# Altium footprint library IC SMD DUAL.PCBLIB: 128 footprints (part 4 of 8)
Each footprint in its own frame and in the unit in brackets; x right, y up, seen from the top. Pads: shape width x height; smd on the part's side, far side on the other; paste and mask are expansions set on the pad; w line width, h text height; cw(c..) or ccw(c..) is an arc to the next point about the centre after c.
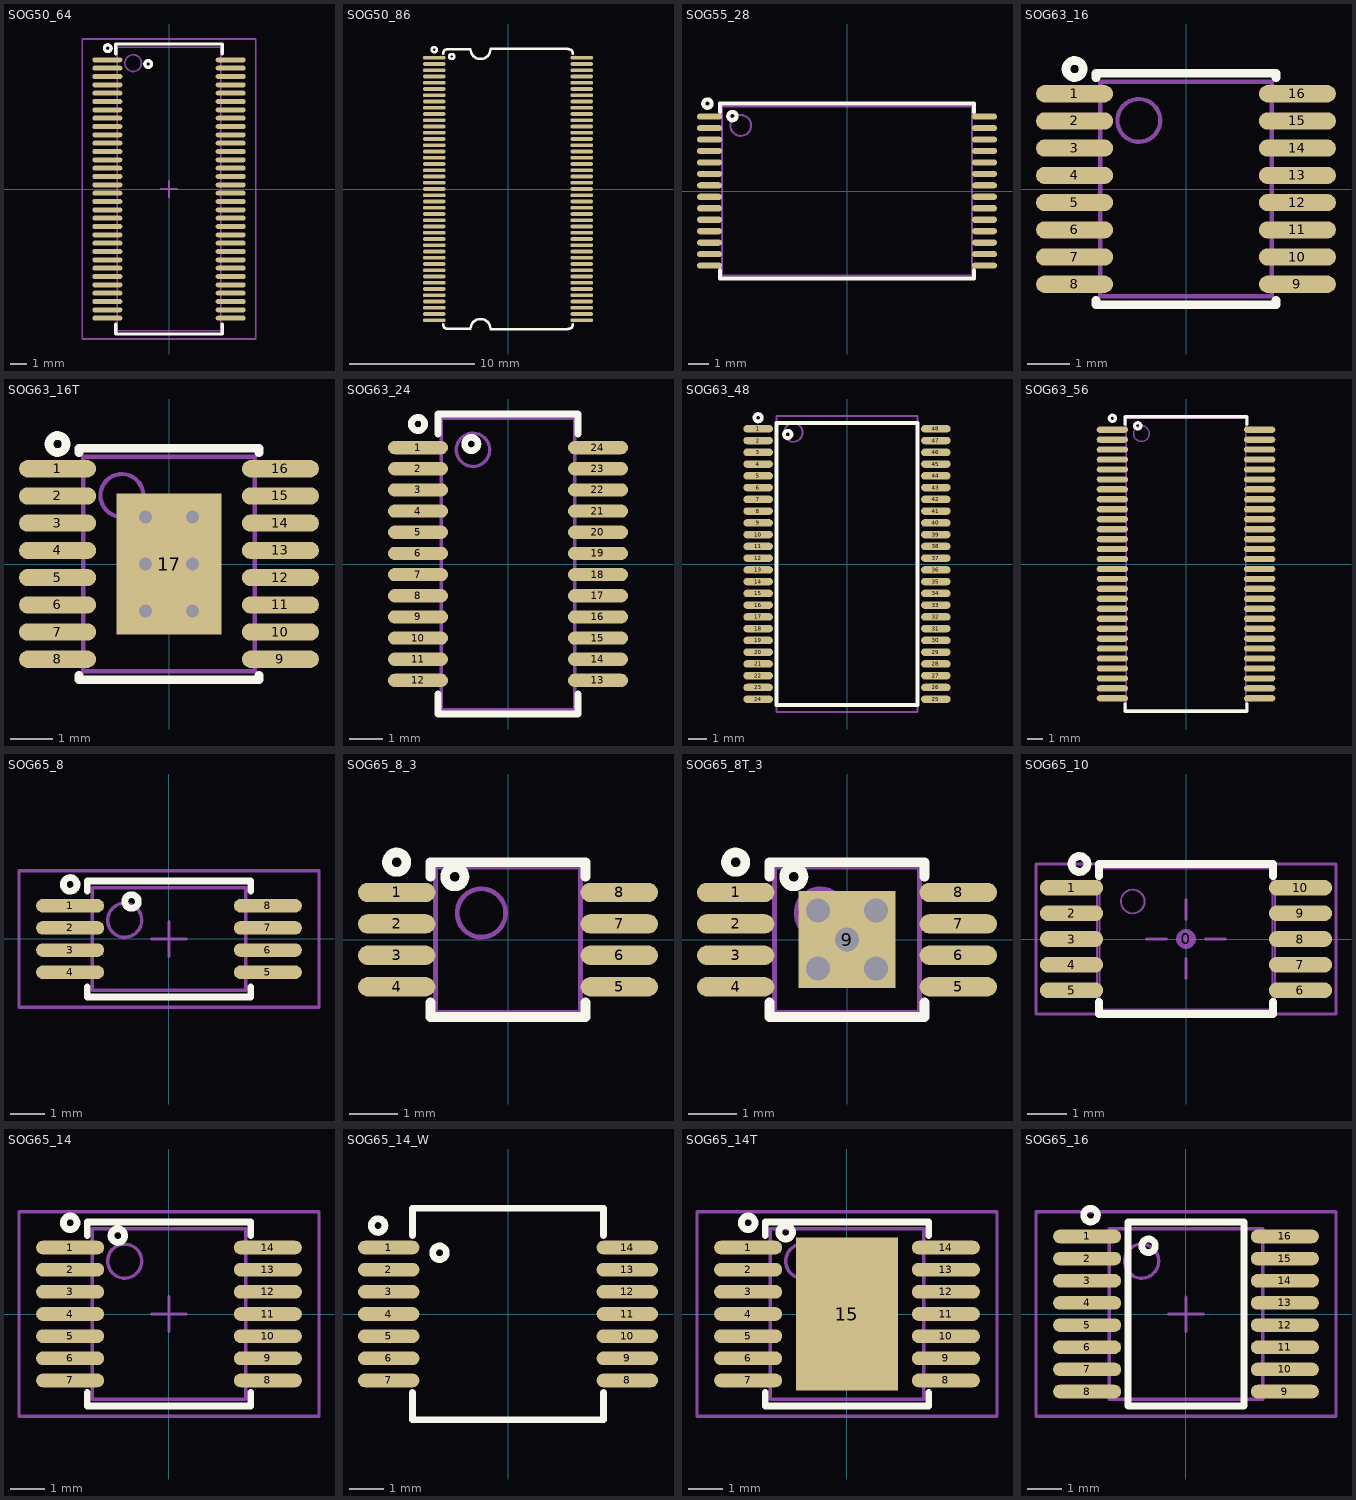
[diagram p3: the footprints below, top view; thin cyan lines are the x and y axes]

## SOG50_64 [mm] "DGG TSSOP (TI), MO-153 (JEDEC), 64Lead, pitch: 0.5mm, 17x6.1x1.2mm"
height 1.2
pads (64):
  oval 1.8x0.3 smd mask+0.075: 1(-3.7,7.75) 2(-3.7,7.25) 3(-3.7,6.75) 4(-3.7,6.25) 5(-3.7,5.75) 6(-3.7,5.25) 7(-3.7,4.75) 8(-3.7,4.25) 9(-3.7,3.75) 10(-3.7,3.25) 11(-3.7,2.75) 12(-3.7,2.25) 13(-3.7,1.75) 14(-3.7,1.25) 15(-3.7,0.75) 16(-3.7,0.25) 17(-3.7,-0.25) 18(-3.7,-0.75) 19(-3.7,-1.25) 20(-3.7,-1.75) 21(-3.7,-2.25) 22(-3.7,-2.75) 23(-3.7,-3.25) 24(-3.7,-3.75) 25(-3.7,-4.25) 26(-3.7,-4.75) 27(-3.7,-5.25) 28(-3.7,-5.75) 29(-3.7,-6.25) 30(-3.7,-6.75) 31(-3.7,-7.25) 32(-3.7,-7.75) 33(3.7,-7.75) 34(3.7,-7.25) 35(3.7,-6.75) 36(3.7,-6.25) 37(3.7,-5.75) 38(3.7,-5.25) 39(3.7,-4.75) 40(3.7,-4.25) 41(3.7,-3.75) 42(3.7,-3.25) 43(3.7,-2.75) 44(3.7,-2.25) 45(3.7,-1.75) 46(3.7,-1.25) 47(3.7,-0.75) 48(3.7,-0.25) 49(3.7,0.25) 50(3.7,0.75) 51(3.7,1.25) 52(3.7,1.75) 53(3.7,2.25) 54(3.7,2.75) 55(3.7,3.25) 56(3.7,3.75) 57(3.7,4.25) 58(3.7,4.75) 59(3.7,5.25) 60(3.7,5.75) 61(3.7,6.25) 62(3.7,6.75) 63(3.7,7.25) 64(3.7,7.75)
TopOverlay:
  circle w0.2: c-1.25,7.5 r0.2
  circle w0.2: c-3.675,8.45 r0.2
  lines w0.2: -3.2,-8.1 -3.2,-8.7 3.2,-8.7 3.2,-8.1 ; -3.2,8.1 -3.2,8.7 3.2,8.7 3.2,8.1
Mechanical13:
  circle w0.1: c-2.15,7.55 r0.5
  lines w0.1: -3.1,-8.5 3.1,-8.5 3.1,8.5 -3.1,8.5 -3.1,-8.5
Mechanical15:
  lines w0.1: -0.5,0 0.5,0 ; 0,-0.5 0,0.5 ; -5.2,-9 5.2,-9 5.2,9 -5.2,9 -5.2,-9
3D body: height 1.2, standoff 0.05, extent -3.1,-8.5 3.1,8.5

## SOG50_86 [mm] "TSOPII-86"
pads (86):
  oval 1.8x0.3 smd mask+0.075: 1(-5.9,10.5) 2(-5.9,10) 3(-5.9,9.5) 4(-5.9,9) 5(-5.9,8.5) 6(-5.9,8) 7(-5.9,7.5) 8(-5.9,7) 9(-5.9,6.5) 10(-5.9,6) 11(-5.9,5.5) 12(-5.9,5) 13(-5.9,4.5) 14(-5.9,4) 15(-5.9,3.5) 16(-5.9,3) 17(-5.9,2.5) 18(-5.9,2) 19(-5.9,1.5) 20(-5.9,1) 21(-5.9,0.5) 22(-5.9,0) 23(-5.9,-0.5) 24(-5.9,-1) 25(-5.9,-1.5) 26(-5.9,-2) 27(-5.9,-2.5) 28(-5.9,-3) 29(-5.9,-3.5) 30(-5.9,-4) 31(-5.9,-4.5) 32(-5.9,-5) 33(-5.9,-5.5) 34(-5.9,-6) 35(-5.9,-6.5) 36(-5.9,-7) 37(-5.9,-7.5) 38(-5.9,-8) 39(-5.9,-8.5) 40(-5.9,-9) 41(-5.9,-9.5) 42(-5.9,-10) 43(-5.9,-10.5) 44(5.9,-10.5) 45(5.9,-10) 46(5.9,-9.5) 47(5.9,-9) 48(5.9,-8.5) 49(5.9,-8) 50(5.9,-7.5) 51(5.9,-7) 52(5.9,-6.5) 53(5.9,-6) 54(5.9,-5.5) 55(5.9,-5) 56(5.9,-4.5) 57(5.9,-4) 58(5.9,-3.5) 59(5.9,-3) 60(5.9,-2.5) 61(5.9,-2) 62(5.9,-1.5) 63(5.9,-1) 64(5.9,-0.5) 65(5.9,0) 66(5.9,0.5) 67(5.9,1) 68(5.9,1.5) 69(5.9,2) 70(5.9,2.5) 71(5.9,3) 72(5.9,3.5) 73(5.9,4) 74(5.9,4.5) 75(5.9,5) 76(5.9,5.5) 77(5.9,6) 78(5.9,6.5) 79(5.9,7) 80(5.9,7.5) 81(5.9,8) 82(5.9,8.5) 83(5.9,9) 84(5.9,9.5) 85(5.9,10) 86(5.9,10.5)
TopOverlay:
  circle w0.2: c-4.5,10.6 r0.2
  circle w0.2: c-5.9,11.145 r0.2
  lines w0.2: -5.2,-10.8 ccw(c-4.8,-10.8) -4.8,-11.2 -3,-11.2 cw(c-2.2,-11.2) -1.4,-11.2 ; -5.2,10.8 cw(c-4.8,10.8) -4.8,11.2 -3,11.2 ccw(c-2.2,11.2) -1.4,11.2 ; -1.4,-11.208 4.8,-11.208 ; -1.4,11.208 4.8,11.208 ; 4.8,-11.2 ccw(c4.8,-10.8) 5.2,-10.8 ; 4.8,11.2 cw(c4.8,10.8) 5.2,10.8
3D body "User Library-TSOP-86.STEP": height 1.06, standoff -0.03, extent -5.895,-11 5.895,10.994

## SOG55_28 [mm] "Z28, TSSOP, 28-Leads, Body 8.10x12.00mm, Pitch 0.55mm"
height 1.2
pads (28):
  oval 1.2x0.3 smd mask+0.075: 1(-6.6,3.575) 2(-6.6,3.025) 3(-6.6,2.475) 4(-6.6,1.925) 5(-6.6,1.375) 6(-6.6,0.825) 7(-6.6,0.275) 8(-6.6,-0.275) 9(-6.6,-0.825) 10(-6.6,-1.375) 11(-6.6,-1.925) 12(-6.6,-2.475) 13(-6.6,-3.025) 14(-6.6,-3.575) 15(6.6,-3.575) 16(6.6,-3.025) 17(6.6,-2.475) 18(6.6,-1.925) 19(6.6,-1.375) 20(6.6,-0.825) 21(6.6,-0.275) 22(6.6,0.275) 23(6.6,0.825) 24(6.6,1.375) 25(6.6,1.925) 26(6.6,2.475) 27(6.6,3.025) 28(6.6,3.575)
TopOverlay:
  circle w0.2: c-6.7,4.2 r0.2
  circle w0.2: c-5.5,3.6 r0.2
  lines w0.2: -6.1,-3.8 -6.1,-4.2 6.1,-4.2 6.1,-3.8 ; -6.1,3.8 -6.1,4.2 6.1,4.2 6.1,3.8
Mechanical13:
  circle w0.1: c-5.1,3.15 r0.5
  lines w0.1: -6,-4.05 -6,4.05 6,4.05 6,-4.05 -6,-4.05
3D body "SOG55_28.step": height 1.2, standoff 0, extent -6.8,-4.05 6.8,4.05

## SOG63_16 [mm] "SOP DBQ, QSOP, 16-Leads, Body 4.90x3.90mm, Pitch 0.635mm"
height 1.65
pads (16):
  oval 1.8x0.4 smd mask+0.075: 1(-2.6,2.222) 2(-2.6,1.587) 3(-2.6,0.953) 4(-2.6,0.318) 5(-2.6,-0.318) 6(-2.6,-0.953) 7(-2.6,-1.587) 8(-2.6,-2.222) 9(2.6,-2.222) 10(2.6,-1.587) 11(2.6,-0.953) 12(2.6,-0.318) 13(2.6,0.318) 14(2.6,0.953) 15(2.6,1.587) 16(2.6,2.222)
TopOverlay:
  circle w0.2: c-2.6,2.8 r0.2
  lines w0.2: -2.1,-2.6 -2.1,-2.7 2.1,-2.7 2.1,-2.6 ; -2.1,2.6 -2.1,2.7 2.1,2.7 2.1,2.6
Mechanical13:
  circle w0.1: c-1.1,1.6 r0.5
  lines w0.1: -2,-2.5 -2,2.5 2,2.5 2,-2.5 -2,-2.5
3D body "User Library-MAX_QSOP16.step": height 1.76, standoff -0.01, extent -3.01,-2.49 3.01,2.49

## SOG63_16T [mm] "SOP, 16-Leads, Body 4.90x3.90mm, Pitch 0.64mm, Thermal Pad 3.30.2x2.44.2mm, IPC Medium Density"
height 1.65
pads (17):
  oval 1.8x0.4 smd mask+0.075: 1(-2.6,2.222) 2(-2.6,1.587) 3(-2.6,0.953) 4(-2.6,0.318) 5(-2.6,-0.318) 6(-2.6,-0.953) 7(-2.6,-1.587) 8(-2.6,-2.222) 9(2.6,-2.222) 10(2.6,-1.587) 11(2.6,-0.953) 12(2.6,-0.318) 13(2.6,0.318) 14(2.6,0.953) 15(2.6,1.587) 16(2.6,2.222)
  rect 2.44x3.3 smd: 17(0,0)
via 0.55,-1.1 diameter 0.5 hole 0.3
via -0.55,-1.1 diameter 0.5 hole 0.3
via 0.55,0 diameter 0.5 hole 0.3
via -0.55,0 diameter 0.5 hole 0.3
via 0.55,1.1 diameter 0.5 hole 0.3
via -0.55,1.1 diameter 0.5 hole 0.3
TopOverlay:
  circle w0.2: c-2.6,2.8 r0.2
  lines w0.2: -2.1,-2.6 -2.1,-2.7 2.1,-2.7 2.1,-2.6 ; -2.1,2.6 -2.1,2.7 2.1,2.7 2.1,2.6
Mechanical13:
  circle w0.1: c-1.1,1.6 r0.5
  lines w0.1: -2,-2.5 2,-2.5 2,2.5 -2,2.5 -2,-2.5
3D body "User Library-MAX_QSOP16.step": height 1.76, standoff -0.01, extent -3.01,-2.49 3.01,2.49

## SOG63_24 [mm] "QSOP24, 8.6X3.9mm, 0.635mm pitch"
pads (24):
  oval 1.8x0.4 smd mask+0.075: 1(-2.7,3.492) 2(-2.7,2.857) 3(-2.7,2.222) 4(-2.7,1.587) 5(-2.7,0.953) 6(-2.7,0.318) 7(-2.7,-0.318) 8(-2.7,-0.953) 9(-2.7,-1.587) 10(-2.7,-2.222) 11(-2.7,-2.857) 12(-2.7,-3.492) 13(2.7,-3.492) 14(2.7,-2.857) 15(2.7,-2.222) 16(2.7,-1.587) 17(2.7,-0.953) 18(2.7,-0.318) 19(2.7,0.318) 20(2.7,0.953) 21(2.7,1.587) 22(2.7,2.222) 23(2.7,2.857) 24(2.7,3.492)
TopOverlay:
  circle w0.2: c-1.1,3.6 r0.2
  circle w0.2: c-2.7,4.2 r0.2
  lines w0.2: -2.1,-3.9 -2.1,-4.5 2.1,-4.5 2.1,-3.9 ; -2.1,3.9 -2.1,4.5 2.1,4.5 2.1,3.9
Mechanical13:
  circle w0.1: c-1.05,3.425 r0.5
  lines w0.1: -2,-4.375 2,-4.375 2,4.375 -2,4.375 -2,-4.375
3D body "User Library-QSOP24.step": height 1.73, standoff 0, extent -3.095,-5.01 3.095,5

## SOG63_48 [mm] "SOT370-1, MO-118, SSOP48, 7.5mm width, 0.635mm pitch"
pads (48):
  oval 1.6x0.4 smd mask+0.075: 1(-4.8,7.302) 2(-4.8,6.667) 3(-4.8,6.032) 4(-4.8,5.397) 5(-4.8,4.763) 6(-4.8,4.127) 7(-4.8,3.492) 8(-4.8,2.857) 9(-4.8,2.222) 10(-4.8,1.587) 11(-4.8,0.953) 12(-4.8,0.318) 13(-4.8,-0.318) 14(-4.8,-0.953) 15(-4.8,-1.587) 16(-4.8,-2.222) 17(-4.8,-2.857) 18(-4.8,-3.492) 19(-4.8,-4.127) 20(-4.8,-4.763) 21(-4.8,-5.397) 22(-4.8,-6.032) 23(-4.8,-6.667) 24(-4.8,-7.302) 25(4.8,-7.302) 26(4.8,-6.667) 27(4.8,-6.032) 28(4.8,-5.397) 29(4.8,-4.763) 30(4.8,-4.127) 31(4.8,-3.492) 32(4.8,-2.857) 33(4.8,-2.222) 34(4.8,-1.587) 35(4.8,-0.953) 36(4.8,-0.318) 37(4.8,0.318) 38(4.8,0.953) 39(4.8,1.587) 40(4.8,2.222) 41(4.8,2.857) 42(4.8,3.492) 43(4.8,4.127) 44(4.8,4.763) 45(4.8,5.397) 46(4.8,6.032) 47(4.8,6.667) 48(4.8,7.302)
TopOverlay:
  circle w0.2: c-4.8,7.9 r0.2
  circle w0.2: c-3.2,7 r0.2
  lines w0.2: -3.81,-7.62 3.81,-7.62 3.81,7.62 -3.81,7.62 -3.81,-7.62
Mechanical13:
  circle w0.1: c-2.9,7.1 r0.5
  lines w0.1: -3.8,-8 3.8,-8 3.8,8 -3.8,8 -3.8,-8
3D body "SOG63_48-.step": height 2.8, standoff 0, extent -5.125,-8 5.125,8

## SOG63_56 [mm] "SSOP 56Lead, pitch: 0.635, 18.5x7.5x2.8mm"
height 2.8
pads (56):
  oval 2x0.4 smd: 1(-4.7,8.572) 2(-4.7,7.938) 3(-4.7,7.302) 4(-4.7,6.667) 5(-4.7,6.032) 6(-4.7,5.397) 7(-4.7,4.763) 8(-4.7,4.127) 9(-4.7,3.492) 10(-4.7,2.857) 11(-4.7,2.222) 12(-4.7,1.587) 13(-4.7,0.953) 14(-4.7,0.318) 15(-4.7,-0.318) 16(-4.7,-0.953) 17(-4.7,-1.587) 18(-4.7,-2.222) 19(-4.7,-2.857) 20(-4.7,-3.492) 21(-4.7,-4.127) 22(-4.7,-4.763) 23(-4.7,-5.397) 24(-4.7,-6.032) 25(-4.7,-6.667) 26(-4.7,-7.302) 27(-4.7,-7.938) 28(-4.7,-8.572) 29(4.7,-8.572) 30(4.7,-7.938) 31(4.7,-7.302) 32(4.7,-6.667) 33(4.7,-6.032) 34(4.7,-5.397) 35(4.7,-4.763) 36(4.7,-4.127) 37(4.7,-3.492) 38(4.7,-2.857) 39(4.7,-2.222) 40(4.7,-1.587) 41(4.7,-0.953) 42(4.7,-0.318) 43(4.7,0.318) 44(4.7,0.953) 45(4.7,1.587) 46(4.7,2.222) 47(4.7,2.857) 48(4.7,3.492) 49(4.7,4.127) 50(4.7,4.763) 51(4.7,5.397) 52(4.7,6.032) 53(4.7,6.667) 54(4.7,7.302) 55(4.7,7.938) 56(4.7,8.572)
TopOverlay:
  circle w0.2: c-4.7,9.3 r0.2
  circle w0.2: c-3.08,8.818 r0.2
  lines w0.2: -3.9,-8.9 -3.9,-9.4 3.9,-9.4 3.9,-8.9 ; -3.9,8.9 -3.9,9.4 3.9,9.4 3.9,8.9
Mechanical13:
  circle w0.1: c-2.845,8.32 r0.5
  lines w0.1: -3.8,-9.3 3.8,-9.3 3.8,9.3 -3.8,9.3 -3.8,-9.3
3D body: height 2.79, standoff 0.2, extent -3.795,-9.27 3.795,9.27

## SOG65_8 [mm] "PW TSSOP (TI), MO-153 (JEDEC), 8Lead, pitch: 0.65mm, 3x4.4x1.2mm"
height 1.2
pads (8):
  oval 2x0.4 smd: 1(-2.9,0.975) 2(-2.9,0.325) 3(-2.9,-0.325) 4(-2.9,-0.975) 5(2.9,-0.975) 6(2.9,-0.325) 7(2.9,0.325) 8(2.9,0.975)
TopOverlay:
  circle w0.2: c-1.1,1.1 r0.2
  circle w0.2: c-2.9,1.6 r0.2
  lines w0.2: -2.4,-1.4 -2.4,-1.7 2.4,-1.7 2.4,-1.4 ; -2.4,1.4 -2.4,1.7 2.4,1.7 2.4,1.4
Mechanical13:
  circle w0.1: c-1.3,0.55 r0.5
  lines w0.1: -2.25,-1.5 2.25,-1.5 2.25,1.5 -2.25,1.5 -2.25,-1.5
Mechanical15:
  lines w0.1: -0.5,0 0.5,0 ; 0,-0.5 0,0.5 ; -4.4,-2 4.4,-2 4.4,2 -4.4,2 -4.4,-2
3D body "User Library-TSSOP-8.STEP": height 1.2, standoff 0, extent -3.2,-1.5 3.2,1.5

## SOG65_8_3 [mm] "TSSOP8, MICRO8, DGK VSSOP-8, pitch: 0.65mm, 3X3mm, MSOP8, RM-8, MS8, MSOP-8, TSSO3X5-G8/D3.1, 8 uMAX, usop8/8uSOP, MO-187AA, MO-153AA, SSOP DCT (TI)"
height 1.2
pads (8):
  oval 1.6x0.4 smd: 1(-2.3,0.975) 2(-2.3,0.325) 3(-2.3,-0.325) 4(-2.3,-0.975) 5(2.3,-0.975) 6(2.3,-0.325) 7(2.3,0.325) 8(2.3,0.975)
TopOverlay:
  circle w0.2: c-1.1,1.3 r0.2
  circle w0.2: c-2.3,1.6 r0.2
  lines w0.2: -1.6,-1.3 -1.6,-1.6 1.6,-1.6 1.6,-1.3 ; -1.6,1.3 -1.6,1.6 1.6,1.6 1.6,1.3
Mechanical13:
  circle w0.1: c-0.55,0.55 r0.5
  lines w0.1: -1.5,-1.5 1.5,-1.5 1.5,1.5 -1.5,1.5 -1.5,-1.5
3D body "User Library-msop-8.step": height 1.15, standoff 0, extent -2.45,-1.5 2.45,1.5

## SOG65_8T_3 [mm]
height 1.2
pads (9):
  oval 1.6x0.4 smd: 1(-2.3,0.975) 2(-2.3,0.325) 3(-2.3,-0.325) 4(-2.3,-0.975) 5(2.3,-0.975) 6(2.3,-0.325) 7(2.3,0.325) 8(2.3,0.975)
  rect 2x2 smd: 9(0,0)
via 0,0 diameter 0.8 hole 0.5
via -0.6,0.6 diameter 0.8 hole 0.5
via -0.6,-0.6 diameter 0.8 hole 0.5
via 0.6,-0.6 diameter 0.8 hole 0.5
via 0.6,0.6 diameter 0.8 hole 0.5
TopOverlay:
  circle w0.2: c-1.1,1.3 r0.2
  circle w0.2: c-2.3,1.6 r0.2
  lines w0.2: -1.6,-1.3 -1.6,-1.6 1.6,-1.6 1.6,-1.3 ; -1.6,1.3 -1.6,1.6 1.6,1.6 1.6,1.3
Mechanical13:
  circle w0.1: c-0.55,0.55 r0.5
  lines w0.1: -1.5,-1.5 1.5,-1.5 1.5,1.5 -1.5,1.5 -1.5,-1.5
3D body "User Library-MSOP-8-1.step": height 0.92, standoff 0, extent -2.5,-1.5 2.5,1.5

## SOG65_10 [mm] "TSSOP, 10 Leads, Body 3.7x4.4mm (max), Pitch 0.65mm"
height 1.2
pads (11):
  round 0.508 on Mech15: 0(0,0)
  oval 1.6x0.4 smd paste-0.051 mask+0.07: 1(-2.9,1.3) 2(-2.9,0.65) 3(-2.9,0) 4(-2.9,-0.65) 5(-2.9,-1.3) 6(2.9,-1.3) 7(2.9,-0.65) 8(2.9,0) 9(2.9,0.65) 10(2.9,1.3)
TopOverlay:
  circle w0.2: c-2.7,1.9 r0.2
  lines w0.2: -2.2,-1.6 -2.2,-1.9 2.2,-1.9 2.2,-1.6 ; -2.2,1.6 -2.2,1.9 2.2,1.9 2.2,1.6
Mechanical13:
  circle w0.05: c-1.35,0.95 r0.3
  lines w0.05: -2.839,-1.45 -2.839,-1.15 ; -2.839,-0.8 -2.839,-0.5 ; -2.839,-0.15 -2.839,0.15 ; -2.839,0.5 -2.839,0.8 ; -2.839,1.15 -2.839,1.45 ; -2.795,-1.45 -2.795,-1.15 ; -2.795,-0.8 -2.795,-0.5 ; -2.795,-0.15 -2.795,0.15 ; -2.795,0.5 -2.795,0.8 ; -2.795,1.15 -2.795,1.45 ; -2.693,-1.45 -2.693,-1.15 ; -2.693,-0.8 -2.693,-0.5 ; -2.693,-0.15 -2.693,0.15 ; -2.693,0.5 -2.693,0.8 ; -2.693,1.15 -2.693,1.45 ; -2.5,-1.45 -2.5,-1.15 ; -2.5,-0.8 -2.5,-0.5 ; -2.5,-0.15 -2.5,0.15 ; -2.5,0.5 -2.5,0.8 ; -2.5,1.15 -2.5,1.45 ; -2.25,-1.45 -3.25,-1.45 -3.25,-1.15 -2.25,-1.15 ; -2.25,-0.8 -3.25,-0.8 -3.25,-0.5 -2.25,-0.5 ; -2.25,-0.15 -3.25,-0.15 -3.25,0.15 -2.25,0.15 ; -2.25,0.5 -3.25,0.5 -3.25,0.8 -2.25,0.8 ; -2.25,1.15 -3.25,1.15 -3.25,1.45 -2.25,1.45 ; 2.25,-1.45 3.25,-1.45 3.25,-1.15 2.25,-1.15 ; 2.25,-0.8 3.25,-0.8 3.25,-0.5 2.25,-0.5 ; 2.25,-0.15 3.25,-0.15 3.25,0.15 2.25,0.15 ; 2.25,0.5 3.25,0.5 3.25,0.8 2.25,0.8 ; 2.25,1.15 3.25,1.15 3.25,1.45 2.25,1.45 ; 2.5,-1.45 2.5,-1.15 ; 2.5,-0.8 2.5,-0.5 ; 2.5,-0.15 2.5,0.15 ; 2.5,0.5 2.5,0.8 ; 2.5,1.15 2.5,1.45 ; 2.693,-1.45 2.693,-1.15 ; 2.693,-0.8 2.693,-0.5 ; 2.693,-0.15 2.693,0.15 ; 2.693,0.5 2.693,0.8 ; 2.693,1.15 2.693,1.45 ; 2.795,-1.45 2.795,-1.15 ; 2.795,-0.8 2.795,-0.5 ; 2.795,-0.15 2.795,0.15 ; 2.795,0.5 2.795,0.8 ; 2.795,1.15 2.795,1.45 ; 2.839,-1.45 2.839,-1.15 ; 2.839,-0.8 2.839,-0.5 ; 2.839,-0.15 2.839,0.15 ; 2.839,0.5 2.839,0.8 ; 2.839,1.15 2.839,1.45 ; -2.25,-1.85 2.25,-1.85 ; -2.25,-1.85 -2.187,-1.787 ; -2.25,-1.85 -2.25,1.85 ; -2.25,1.85 -2.187,1.787 ; -2.25,1.85 2.25,1.85 ; -2.187,-1.787 2.187,-1.787 ; -2.187,-1.787 -2.187,1.787 ; -2.187,1.787 2.187,1.787 ; 2.187,-1.787 2.25,-1.85 ; 2.187,-1.787 2.187,1.787 ; 2.187,1.787 2.25,1.85 ; 2.25,-1.85 2.25,1.85
Mechanical15:
  lines w0.076: -1,0 -0.5,0 ; 0,-1 0,-0.5 ; 0,0.5 0,1 ; 0.5,0 1,0 ; -3.8,-1.9 3.8,-1.9 3.8,1.9 -3.8,1.9 -3.8,-1.9
3D body "TSSOP65P640X120-10N.STEP": height 1.2, standoff 0, extent -3.25,-1.85 3.25,1.85

## SOG65_14 [mm] "PW TSSOP (TI), MO-153-AB (JEDEC), 14Lead, pitch: 0.65mm, 5x4.4x1.2mm"
height 1.2
pads (14):
  oval 2x0.4 smd: 1(-2.9,1.95) 2(-2.9,1.3) 3(-2.9,0.65) 4(-2.9,0) 5(-2.9,-0.65) 6(-2.9,-1.3) 7(-2.9,-1.95) 8(2.9,-1.95) 9(2.9,-1.3) 10(2.9,-0.65) 11(2.9,0) 12(2.9,0.65) 13(2.9,1.3) 14(2.9,1.95)
TopOverlay:
  circle w0.2: c-2.9,2.675 r0.2
  circle w0.2: c-1.5,2.3 r0.2
  lines w0.2: -2.4,-2.3 -2.4,-2.7 2.4,-2.7 2.4,-2.3 ; -2.4,2.3 -2.4,2.7 2.4,2.7 2.4,2.3
Mechanical13:
  circle w0.1: c-1.3,1.55 r0.5
  lines w0.1: -2.25,-2.5 -2.25,2.5 2.25,2.5 2.25,-2.5 -2.25,-2.5
Mechanical15:
  lines w0.1: -0.5,0 0.5,0 ; 0,-0.5 0,0.5 ; -4.4,-3 -4.4,3 4.4,3 4.4,-3 -4.4,-3
3D body "User Library-TSSOP14-1.step": height 1.1, standoff 0, extent -3.2,-2.5 3.2,2.5

## SOG65_14_W [mm] "SSOP 5.3mm Width 0.65mm pitch, SOT337-1, SOT402-1, MO-150AB(JEDEC),"
pads (14):
  oval 1.8x0.4 smd mask+0.075: 1(-3.5,1.95) 2(-3.5,1.3) 3(-3.5,0.65) 4(-3.5,0) 5(-3.5,-0.65) 6(-3.5,-1.3) 7(-3.5,-1.95) 8(3.5,-1.95) 9(3.5,-1.3) 10(3.5,-0.65) 11(3.5,0) 12(3.5,0.65) 13(3.5,1.3) 14(3.5,1.95)
TopOverlay:
  circle w0.2: c-3.81,2.595 r0.2
  circle w0.2: c-2.01,1.795 r0.2
  lines w0.2: -2.8,-2.3 -2.8,-3.1 2.8,-3.1 2.8,-2.3 ; -2.8,2.3 -2.8,3.1 2.8,3.1 2.8,2.3
3D body "SOG65_14_W-.step": height 2, standoff 0, extent -3.9,-3.25 3.9,3.25

## SOG65_14T [mm] "TSSOP 4.4mm(MAXIM), MO-153-ABT (JEDEC), 14Lead, pitch: 0.65mm, 5x4.4x1.2mm"
height 1.2
pads (15):
  oval 2x0.4 smd: 1(-2.9,1.95) 2(-2.9,1.3) 3(-2.9,0.65) 4(-2.9,0) 5(-2.9,-0.65) 6(-2.9,-1.3) 7(-2.9,-1.95) 8(2.9,-1.95) 9(2.9,-1.3) 10(2.9,-0.65) 11(2.9,0) 12(2.9,0.65) 13(2.9,1.3) 14(2.9,1.95)
  rect 3x4.5 smd mask+0.1: 15(0,0)
TopOverlay:
  circle w0.2: c-1.8,2.4 r0.2
  circle w0.2: c-2.9,2.675 r0.2
  lines w0.2: -2.4,-2.3 -2.4,-2.7 2.4,-2.7 2.4,-2.3 ; -2.4,2.3 -2.4,2.7 2.4,2.7 2.4,2.3
Mechanical13:
  circle w0.1: c-1.3,1.55 r0.5
  lines w0.1: -2.25,-2.5 2.25,-2.5 2.25,2.5 -2.25,2.5 -2.25,-2.5
Mechanical15:
  lines w0.1: -0.5,0 0.5,0 ; 0,-0.5 0,0.5 ; -4.4,-3 4.4,-3 4.4,3 -4.4,3 -4.4,-3
3D body "User Library-TSSOP14-1.step": height 1.1, standoff 0, extent -3.2,-2.5 3.2,2.5

## SOG65_16 [mm] "PW TSSOP (TI), MO-153-AB (JEDEC), 16Lead, pitch: 0.65mm, 5x4.4x1.2mm"
height 1.2
pads (16):
  oval 2x0.4 smd: 1(-2.9,2.275) 2(-2.9,1.625) 3(-2.9,0.975) 4(-2.9,0.325) 5(-2.9,-0.325) 6(-2.9,-0.975) 7(-2.9,-1.625) 8(-2.9,-2.275) 9(2.9,-2.275) 10(2.9,-1.625) 11(2.9,-0.975) 12(2.9,-0.325) 13(2.9,0.325) 14(2.9,0.975) 15(2.9,1.625) 16(2.9,2.275)
TopOverlay:
  circle w0.2: c-1.1,2 r0.2
  circle w0.2: c-2.8,2.9 r0.2
  lines w0.2: -1.7,-2.7 -1.7,2.7 1.7,2.7 1.7,-2.7 -1.7,-2.7
Mechanical13:
  circle w0.1: c-1.3,1.55 r0.5
  lines w0.1: -2.25,-2.5 2.25,-2.5 2.25,2.5 -2.25,2.5 -2.25,-2.5
Mechanical15:
  lines w0.1: -0.5,0 0.5,0 ; 0,-0.5 0,0.5 ; -4.4,-3 4.4,-3 4.4,3 -4.4,3 -4.4,-3
3D body "User Library-TSSOP-16-1.step": height 1.1, standoff 0, extent -3.2,-2.5 3.2,2.5